# Altium footprint library CHIP.PcbLib: 86 footprints (part 2 of 6)
Each footprint in its own frame and in the unit in brackets; x right, y up, seen from the top. Pads: shape width x height; smd on the part's side, far side on the other; paste and mask are expansions set on the pad; w line width, h text height; cw(c..) or ccw(c..) is an arc to the next point about the centre after c.
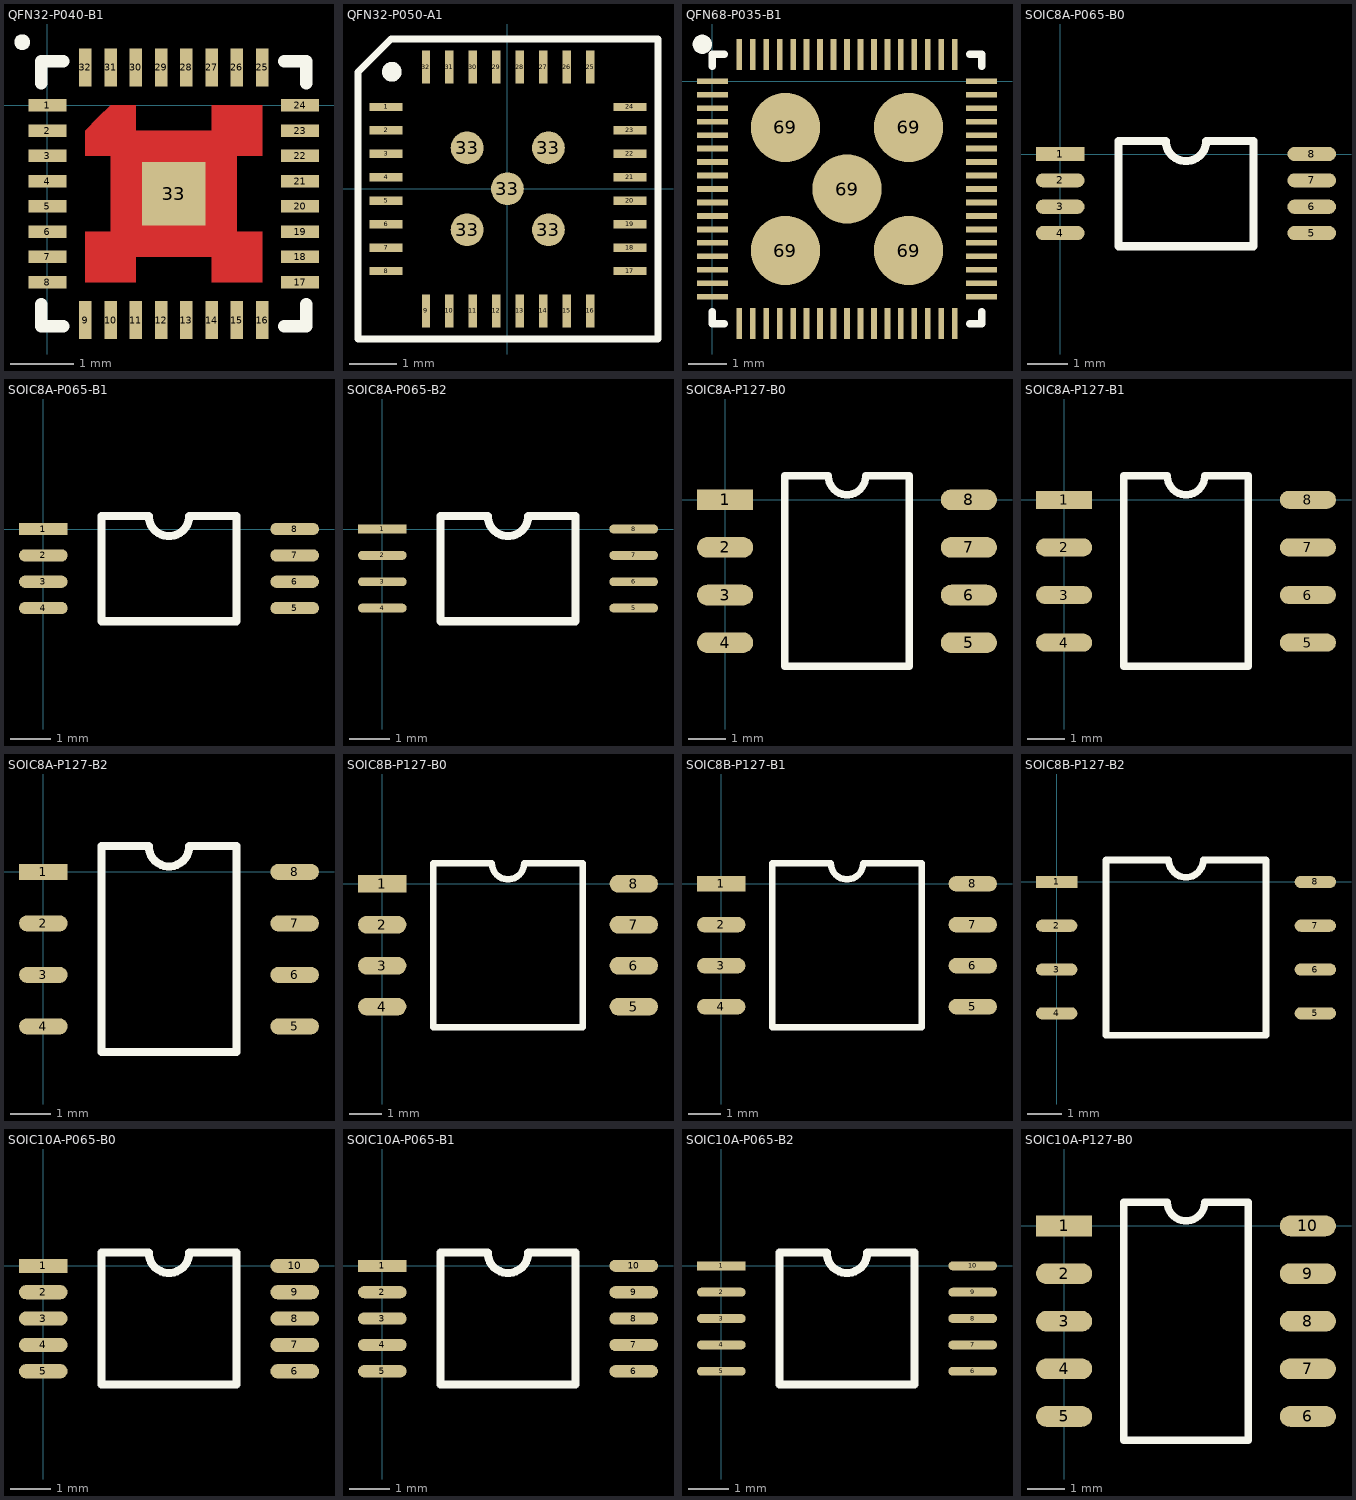
[diagram p1: the footprints below, top view; thin cyan lines are the x and y axes]

## QFN32-P040-B1 [mm]
pads (33):
  rect 0.6x0.2 smd: 1(0,0) 2(0,-0.4) 3(0,-0.8) 4(0,-1.2) 5(0,-1.6) 6(0,-2) 7(0,-2.4) 8(0,-2.8) 17(4,-2.8) 18(4,-2.4) 19(4,-2) 20(4,-1.6) 21(4,-1.2) 22(4,-0.8) 23(4,-0.4) 24(4,0)
  rect 0.2x0.6 smd: 9(0.6,-3.4) 10(1,-3.4) 11(1.4,-3.4) 12(1.8,-3.4) 13(2.2,-3.4) 14(2.6,-3.4) 15(3,-3.4) 16(3.4,-3.4) 25(3.4,0.6) 26(3,0.6) 27(2.6,0.6) 28(2.2,0.6) 29(1.8,0.6) 30(1.4,0.6) 31(1,0.6) 32(0.6,0.6)
  rect 1x1 smd: 33(2,-1.4)
Top Layer:
  region: 0.6,0
  region: 0.8,-0.2 1,0 1.4,0 1.4,-0.4 2.6,-0.4 2.6,0 3.4,0 3.4,-0.8 3,-0.8 3,-2 3.4,-2 3.4,-2.8 2.6,-2.8 2.6,-2.4 1.4,-2.4 1.4,-2.8 0.6,-2.8 0.6,-2 1,-2 1,-0.8 0.6,-0.8 0.6,-0.4
Top Overlay:
  circle w0.15: c-0.4,1 r0.05
  lines w0.2: -0.1,-3.15 -0.1,-3.5 0.25,-3.5 ; -0.1,0.35 -0.1,0.7 0.25,0.7 ; 3.75,-3.5 4.1,-3.5 4.1,-3.15 ; 3.75,0.7 4.1,0.7 4.1,0.35
Top Solder:
  region: 0.95,0.1 1.5,0.1 1.5,-0.3 2.5,-0.3 2.5,0.1 3.5,0.1 3.5,-0.9 3.1,-0.9 3.1,-1.9 3.5,-1.9 3.5,-2.9 2.5,-2.9 2.5,-2.5 1.5,-2.5 1.5,-2.9 0.5,-2.9 0.5,-1.9 0.9,-1.9 0.9,-0.9 0.5,-0.9 0.5,-0.35

## QFN32-P050-A1 [mm]
pads (37):
  rect 0.7x0.18 smd: 1(-2.588,1.745) 2(-2.588,1.245) 3(-2.588,0.745) 4(-2.588,0.245) 5(-2.588,-0.255) 6(-2.588,-0.755) 7(-2.588,-1.255) 8(-2.588,-1.755) 17(2.612,-1.755) 18(2.612,-1.255) 19(2.612,-0.755) 20(2.612,-0.255) 21(2.612,0.245) 22(2.612,0.745) 23(2.612,1.245) 24(2.612,1.745)
  rect 0.18x0.7 smd: 9(-1.738,-2.605) 10(-1.238,-2.605) 11(-0.738,-2.605) 12(-0.238,-2.605) 13(0.262,-2.605) 14(0.762,-2.605) 15(1.262,-2.605) 16(1.762,-2.605) 25(1.762,2.595) 26(1.262,2.595) 27(0.762,2.595) 28(0.262,2.595) 29(-0.238,2.595) 30(-0.738,2.595) 31(-1.238,2.595) 32(-1.738,2.595)
  round 0.7 smd paste+0: 33(-0.861,-0.874) 33(-0.861,0.873) 33(0,0) 33(0.875,-0.874) 33(0.875,0.873)
Top Overlay:
  circle w0.254: c-2.465,2.496 r0.083
  lines w0.15: -3.188,-3.205 -3.188,2.495 -2.488,3.195 3.212,3.195 3.212,-3.205 -3.188,-3.205
3D body "User Library-QFN32-1.STEP": height 0.9, standoff -0.03, extent -2.49,-2.506 2.511,2.494

## QFN68-P035-B1 [mm]
pads (73):
  rect 0.8x0.15 smd mask+0.05: 1(0,0) 2(0,-0.35) 3(0,-0.7) 4(0,-1.05) 5(0,-1.4) 6(0,-1.75) 7(0,-2.1) 8(0,-2.45) 9(0,-2.8) 10(0,-3.15) 11(0,-3.5) 12(0,-3.85) 13(0,-4.2) 14(0,-4.55) 15(0,-4.9) 16(0,-5.25) 17(0,-5.6) 35(7,-5.6) 36(7,-5.25) 37(7,-4.9) 38(7,-4.55) 39(7,-4.2) 40(7,-3.85) 41(7,-3.5) 42(7,-3.15) 43(7,-2.8) 44(7,-2.45) 45(7,-2.1) 46(7,-1.75) 47(7,-1.4) 48(7,-1.05) 49(7,-0.7) 50(7,-0.35) 51(7,0)
  rect 0.15x0.8 smd mask+0.05: 18(0.7,-6.3) 19(1.05,-6.3) 20(1.4,-6.3) 21(1.75,-6.3) 22(2.1,-6.3) 23(2.45,-6.3) 24(2.8,-6.3) 25(3.15,-6.3) 26(3.5,-6.3) 27(3.85,-6.3) 28(4.2,-6.3) 29(4.55,-6.3) 30(4.9,-6.3) 31(5.25,-6.3) 32(5.6,-6.3) 33(5.95,-6.3) 34(6.3,-6.3) 52(6.3,0.7) 53(5.95,0.7) 54(5.6,0.7) 55(5.25,0.7) 56(4.9,0.7) 57(4.55,0.7) 58(4.2,0.7) 59(3.85,0.7) 60(3.5,0.7) 61(3.15,0.7) 62(2.8,0.7) 63(2.45,0.7) 64(2.1,0.7) 65(1.75,0.7) 66(1.4,0.7) 67(1.05,0.7) 68(0.7,0.7)
  round 1.8 smd: 69(1.9,-4.4) 69(1.9,-1.2) 69(3.5,-2.8) 69(5.1,-4.4) 69(5.1,-1.2)
Top Overlay:
  circle w0.25: c-0.262,0.962 r0.125
  lines w0.2: 0,-6 0,-6.3 0.3,-6.3 ; 0,0.4 0,0.7 0.3,0.7 ; 6.7,-6.3 7,-6.3 7,-6 ; 6.7,0.7 7,0.7 7,0.4

## SOIC8A-P065-B0 [mm]
pads (8):
  rect 1.2x0.35 smd: 1(0,0)
  oval 1.2x0.35 smd: 2(0,-0.65) 3(0,-1.3) 4(0,-1.95) 5(6.2,-1.95) 6(6.2,-1.3) 7(6.2,-0.65) 8(6.2,0)
Top Overlay:
  lines w0.2: 1.435,-2.275 4.765,-2.275 4.765,0.325 3.6,0.325 cw(c3.1,0.325) 2.6,0.325 1.435,0.325 1.435,-2.275

## SOIC8A-P065-B1 [mm]
pads (8):
  rect 1.2x0.3 smd: 1(0,0)
  oval 1.2x0.3 smd: 2(0,-0.65) 3(0,-1.3) 4(0,-1.95) 5(6.2,-1.95) 6(6.2,-1.3) 7(6.2,-0.65) 8(6.2,0)
Top Overlay:
  lines w0.2: 1.435,-2.275 4.765,-2.275 4.765,0.325 3.6,0.325 cw(c3.1,0.325) 2.6,0.325 1.435,0.325 1.435,-2.275

## SOIC8A-P065-B2 [mm]
pads (8):
  rect 1.2x0.22 smd: 1(0,0)
  oval 1.2x0.22 smd: 2(0,-0.65) 3(0,-1.3) 4(0,-1.95) 5(6.2,-1.95) 6(6.2,-1.3) 7(6.2,-0.65) 8(6.2,0)
Top Overlay:
  lines w0.2: 1.435,-2.275 4.765,-2.275 4.765,0.325 3.6,0.325 cw(c3.1,0.325) 2.6,0.325 1.435,0.325 1.435,-2.275

## SOIC8A-P127-B0 [mm]
pads (8):
  rect 1.5x0.55 smd: 1(0,0)
  oval 1.5x0.55 smd: 2(0,-1.27) 3(0,-2.54) 4(0,-3.81) 5(6.5,-3.81) 6(6.5,-2.54) 7(6.5,-1.27) 8(6.5,0)
Top Overlay:
  lines w0.2: 1.585,-4.445 4.915,-4.445 4.915,0.635 3.75,0.635 cw(c3.25,0.635) 2.75,0.635 1.585,0.635 1.585,-4.445
3D body "SW3DPS-SO-8 (PIC12FXXX)-DEFAULT.STEP": height 1.6, standoff 0, extent 0.255,-4.364 6.245,0.536

## SOIC8A-P127-B1 [mm]
pads (8):
  rect 1.5x0.48 smd: 1(0,0)
  oval 1.5x0.48 smd: 2(0,-1.27) 3(0,-2.54) 4(0,-3.81) 5(6.5,-3.81) 6(6.5,-2.54) 7(6.5,-1.27) 8(6.5,0)
Top Overlay:
  lines w0.2: 1.585,-4.445 1.585,0.635 2.75,0.635 ccw(c3.25,0.635) 3.75,0.635 4.915,0.635 4.915,-4.445 1.585,-4.445
3D body "SW3DPS-SO-8 (PIC12FXXX)-DEFAULT.STEP": height 1.6, standoff 0, extent 0.255,-4.364 6.245,0.536

## SOIC8A-P127-B2 [mm]
pads (8):
  rect 1.2x0.4 smd: 1(0,0)
  oval 1.2x0.4 smd: 2(0,-1.27) 3(0,-2.54) 4(0,-3.81) 5(6.2,-3.81) 6(6.2,-2.54) 7(6.2,-1.27) 8(6.2,0)
Top Overlay:
  lines w0.2: 1.435,-4.445 1.435,0.635 2.6,0.635 ccw(c3.1,0.635) 3.6,0.635 4.765,0.635 4.765,-4.445 1.435,-4.445
3D body "SW3DPS-SO-8 (PIC12FXXX)-DEFAULT.STEP": height 1.6, standoff 0, extent 0.121,-4.364 6.111,0.536

## SOIC8B-P127-B0 [mm]
pads (8):
  rect 1.5x0.55 smd: 1(0,0)
  oval 1.5x0.55 smd: 2(0,-1.27) 3(0,-2.54) 4(0,-3.81) 5(7.8,-3.81) 6(7.8,-2.54) 7(7.8,-1.27) 8(7.8,0)
Top Overlay:
  lines w0.2: 1.585,-4.445 6.215,-4.445 6.215,0.635 4.4,0.635 cw(c3.9,0.635) 3.4,0.635 1.585,0.635 1.585,-4.445

## SOIC8B-P127-B1 [mm]
pads (8):
  rect 1.5x0.48 smd: 1(0,0)
  oval 1.5x0.48 smd: 2(0,-1.27) 3(0,-2.54) 4(0,-3.81) 5(7.8,-3.81) 6(7.8,-2.54) 7(7.8,-1.27) 8(7.8,0)
Top Overlay:
  lines w0.2: 1.585,-4.445 6.215,-4.445 6.215,0.635 4.4,0.635 cw(c3.9,0.635) 3.4,0.635 1.585,0.635 1.585,-4.445

## SOIC8B-P127-B2 [mm]
pads (8):
  rect 1.2x0.35 smd: 1(0,0)
  oval 1.2x0.35 smd: 2(0,-1.27) 3(0,-2.54) 4(0,-3.81) 5(7.5,-3.81) 6(7.5,-2.54) 7(7.5,-1.27) 8(7.5,0)
Top Overlay:
  lines w0.2: 1.435,-4.445 1.435,0.635 3.25,0.635 ccw(c3.75,0.635) 4.25,0.635 6.065,0.635 6.065,-4.445 1.435,-4.445

## SOIC10A-P065-B0 [mm]
pads (10):
  rect 1.2x0.35 smd: 1(0,0)
  oval 1.2x0.35 smd: 2(0,-0.65) 3(0,-1.3) 4(0,-1.95) 5(0,-2.6) 6(6.2,-2.6) 7(6.2,-1.95) 8(6.2,-1.3) 9(6.2,-0.65) 10(6.2,0)
Top Overlay:
  lines w0.2: 1.435,-2.925 4.765,-2.925 4.765,0.325 3.6,0.325 cw(c3.1,0.325) 2.6,0.325 1.435,0.325 1.435,-2.925

## SOIC10A-P065-B1 [mm]
pads (10):
  rect 1.2x0.3 smd: 1(0,0)
  oval 1.2x0.3 smd: 2(0,-0.65) 3(0,-1.3) 4(0,-1.95) 5(0,-2.6) 6(6.2,-2.6) 7(6.2,-1.95) 8(6.2,-1.3) 9(6.2,-0.65) 10(6.2,0)
Top Overlay:
  lines w0.2: 1.435,-2.925 4.765,-2.925 4.765,0.325 3.6,0.325 cw(c3.1,0.325) 2.6,0.325 1.435,0.325 1.435,-2.925

## SOIC10A-P065-B2 [mm]
pads (10):
  rect 1.2x0.22 smd: 1(0,0)
  oval 1.2x0.22 smd: 2(0,-0.65) 3(0,-1.3) 4(0,-1.95) 5(0,-2.6) 6(6.2,-2.6) 7(6.2,-1.95) 8(6.2,-1.3) 9(6.2,-0.65) 10(6.2,0)
Top Overlay:
  lines w0.2: 1.435,-2.925 1.435,0.325 2.6,0.325 ccw(c3.1,0.325) 3.6,0.325 4.765,0.325 4.765,-2.925 1.435,-2.925

## SOIC10A-P127-B0 [mm]
pads (10):
  rect 1.5x0.55 smd: 1(0,0)
  oval 1.5x0.55 smd: 2(0,-1.27) 3(0,-2.54) 4(0,-3.81) 5(0,-5.08) 6(6.5,-5.08) 7(6.5,-3.81) 8(6.5,-2.54) 9(6.5,-1.27) 10(6.5,0)
Top Overlay:
  lines w0.2: 1.585,-5.715 1.585,0.635 2.75,0.635 ccw(c3.25,0.635) 3.75,0.635 4.915,0.635 4.915,-5.715 1.585,-5.715